# Altium footprint library 3.Inductors&Transformers.PcbLib: 51 footprints (part 4 of 4)
Each footprint in its own frame and in the unit in brackets; x right, y up, seen from the top. Pads: shape width x height; smd on the part's side, far side on the other; paste and mask are expansions set on the pad; w line width, h text height; cw(c..) or ccw(c..) is an arc to the next point about the centre after c.
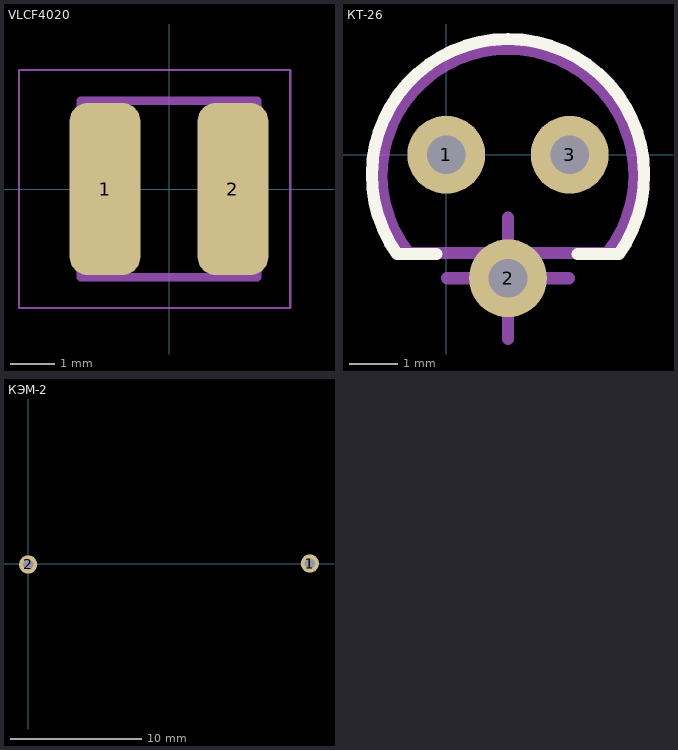
[diagram p3: the footprints below, top view; thin cyan lines are the x and y axes]

## VLCF4020 [mm]
pads (2):
  rrect50% 1.6x3.9 smd: 1(-1.45,0) 2(1.45,0)
Mechanical 13:
  lines w0.2: -2,-2 -2,2 2,2 2,-2 -2,-2
Mechanical 15:
  lines w0.05: -3.4,-2.7 -3.4,2.7 2.75,2.7 2.75,-2.7 -3.4,-2.7
3D body "VLCF4020T-2R2N1R7.stp": height 2, standoff 0, extent -2.075,-2 2.075,2

## КТ-26 [mm] "Аналог TO-92 // Масса не более 1г //  LIV"
height 5.2
pads (3):
  round 1.6 hole 0.8: 1(0,0) 2(1.27,-2.54) 3(2.54,0)
Top Overlay:
  lines w0.25: -0.2,-2.04 -1.014,-2.04 cw(c1.27,-0.42) 3.554,-2.04 2.7,-2.04
Mechanical 1:
  lines w0.25: -0.782,-2.02 3.288,-2.02 ; -0.782,-2.017 cw(c1.27,-0.42) 3.322,-2.017 ; 0.02,-2.54 2.52,-2.54 ; 1.27,-3.79 1.27,-1.29
3D body "TO-92.STEP": height 7.7, standoff -2, extent -1.327,-2.815 3.87,2.16

## КЭМ-2 [mm]
pads (2):
  round 1.4 hole 0.8: 1(21.5,0) 2(-0.025,-0.075)
3D body "KLS7-3050.stp": height 4.43, standoff -1.45, extent -0.3,-0.852 21.789,0.9